# Altium footprint library WR-TBL_Wire Protector.PcbLib: 120 footprints (part 6 of 8)
Each footprint in its own frame and in the unit in brackets; x right, y up, seen from the top. Pads: shape width x height; smd on the part's side, far side on the other; paste and mask are expansions set on the pad; w line width, h text height; cw(c..) or ccw(c..) is an arc to the next point about the centre after c.
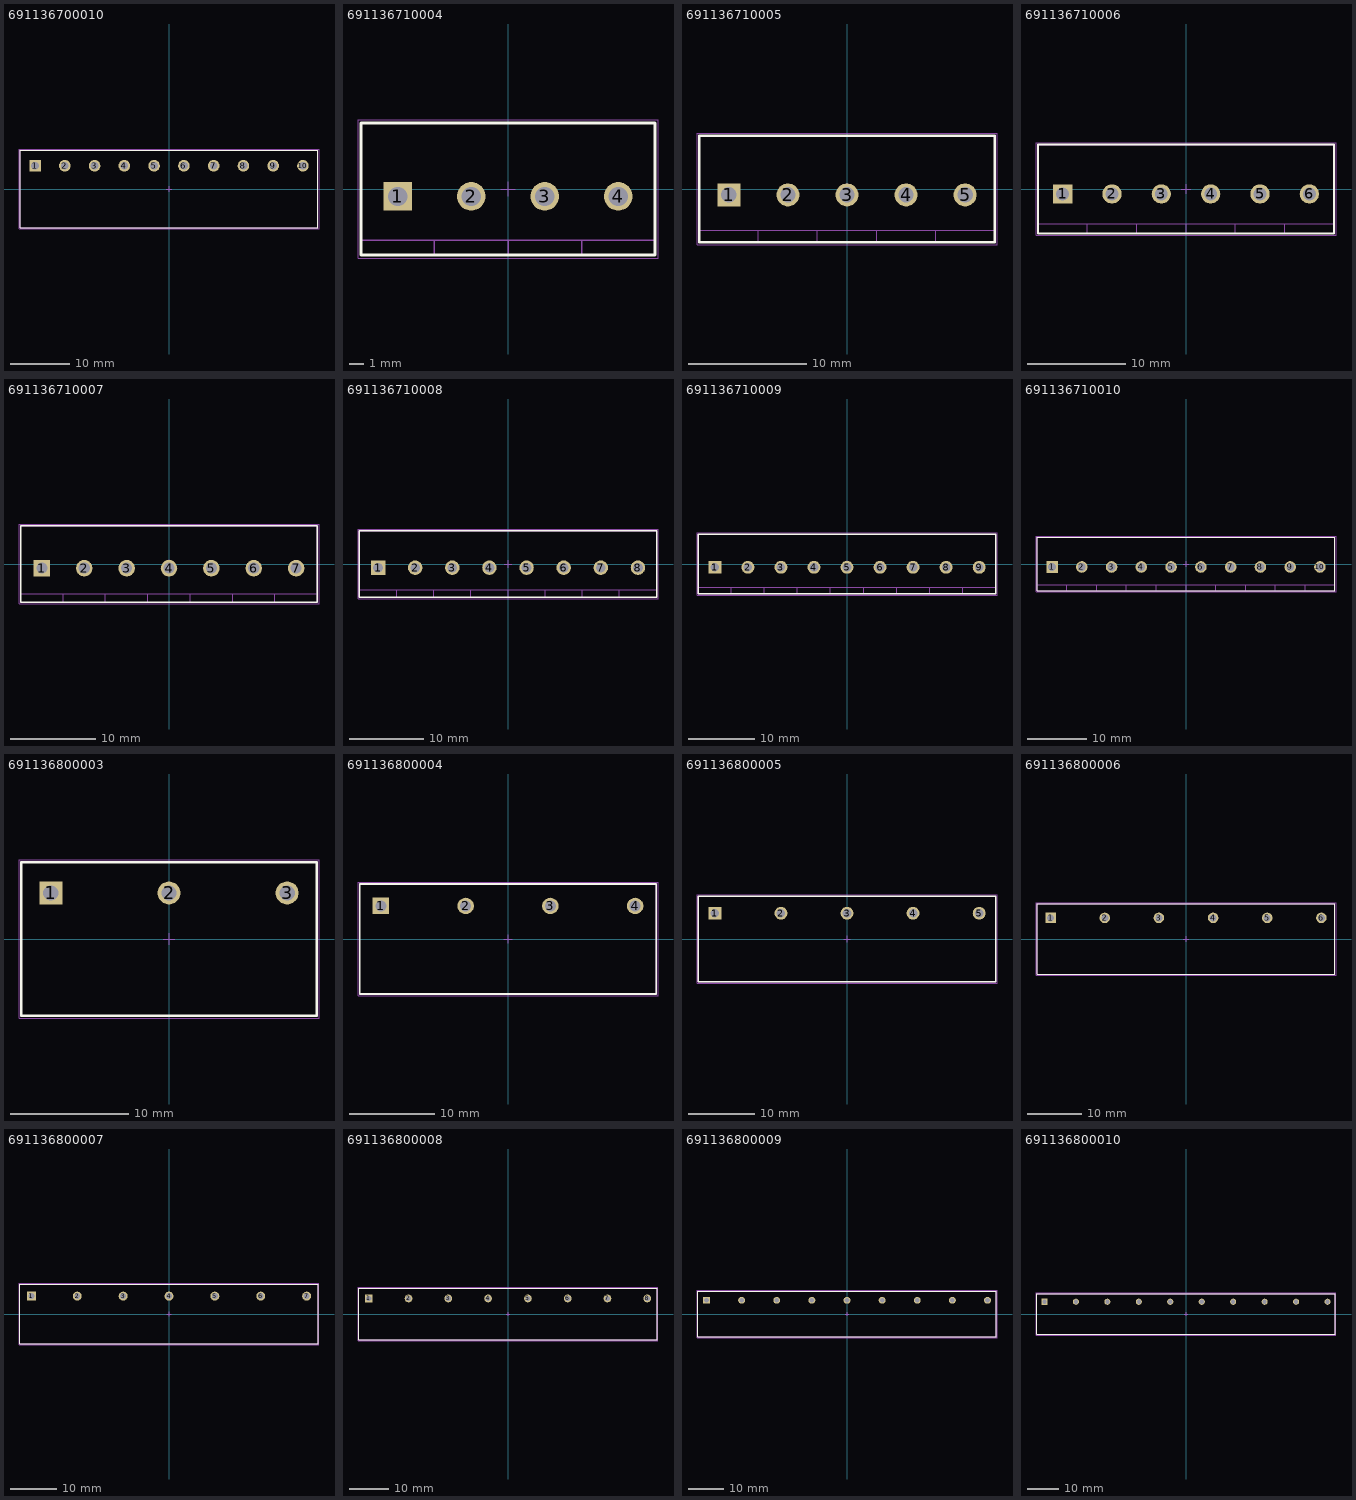
[diagram p5: the footprints below, top view; thin cyan lines are the x and y axes]

## 691136700010 [mm] "Serie 1367 - 5.00 mm _ 10 pins"
height 9
pads (10):
  rect 1.95x1.95 hole 1.3: 1(-22.5,3.9)
  round 1.95 hole 1.3: 2(-17.5,3.9) 3(-12.5,3.9) 4(-7.5,3.9) 5(-2.5,3.9) 6(2.5,3.9) 7(7.5,3.9) 8(12.5,3.9) 9(17.5,3.9) 10(22.5,3.9)
Top Overlay:
  lines w0.2: -25,-6.5 -25,6.5 25,6.5 25,-6.5 -25,-6.5
Mechanical 13:
  lines w0.1: -25,-6.5 25,-6.5 25,6.5 -25,6.5 -25,-6.5
Mechanical 15:
  lines w0.05: -0.5,0 0.5,0 ; 0,-0.5 0,0.5 ; -25.2,-6.7 -25.2,6.7 25.2,6.7 25.2,-6.7 -25.2,-6.7
3D body "691136700010.stp": height 9.1, standoff -5.9, extent -25,-6.5 25,6.5

## 691136710004 [mm] "Serie 1367 - 5.00 mm _ 4 pins"
height 13
pads (4):
  rect 1.95x1.95 hole 1.3: 1(-7.5,-0.5)
  round 1.95 hole 1.3: 2(-2.5,-0.5) 3(2.5,-0.5) 4(7.5,-0.5)
Top Overlay:
  lines w0.2: -10,-4.5 10,-4.5 10,4.5 -10,4.5 -10,-4.5
Mechanical 13:
  lines w0.1: -10,-3.5 10,-3.5 ; -5,-4.5 -5,-3.5 ; 0,-4.5 0,-3.5 ; 5,-4.5 5,-3.5 ; -10,-4.5 -10,4.5 10,4.5 10,-4.5 -10,-4.5
Mechanical 15:
  lines w0.05: -0.5,0 0.5,0 ; 0,-0.5 0,0.5 ; -10.2,-4.7 -10.2,4.7 10.2,4.7 10.2,-4.7 -10.2,-4.7
3D body "691136710004.stp": height 13.1, standoff -3.9, extent -10,-4.5 10,4.5

## 691136710005 [mm] "Serie 1367 - 5.00 mm _ 5 pins"
height 13
pads (5):
  rect 1.95x1.95 hole 1.3: 1(-10,-0.5)
  round 1.95 hole 1.3: 2(-5,-0.5) 3(0,-0.5) 4(5,-0.5) 5(10,-0.5)
Top Overlay:
  lines w0.2: -12.5,-4.5 -12.5,4.5 12.5,4.5 12.5,-4.5 -12.5,-4.5
Mechanical 13:
  lines w0.1: -12.5,-3.5 12.5,-3.5 ; -7.5,-4.5 -7.5,-3.5 ; -2.5,-4.5 -2.5,-3.5 ; 2.5,-4.5 2.5,-3.5 ; 7.5,-4.5 7.5,-3.5 ; -12.5,-4.5 12.5,-4.5 12.5,4.5 -12.5,4.5 -12.5,-4.5
Mechanical 15:
  lines w0.05: -0.5,0 0.5,0 ; 0,-0.5 0,0.5 ; -12.7,-4.7 12.7,-4.7 12.7,4.7 -12.7,4.7 -12.7,-4.7
3D body "691136710005.stp": height 13.1, standoff -3.9, extent -12.5,-4.5 12.5,4.5

## 691136710006 [mm] "Serie 1367 - 5.00 mm _ 6 pins"
height 13
pads (6):
  rect 1.95x1.95 hole 1.3: 1(-12.5,-0.5)
  round 1.95 hole 1.3: 2(-7.5,-0.5) 3(-2.5,-0.5) 4(2.5,-0.5) 5(7.5,-0.5) 6(12.5,-0.5)
Top Overlay:
  lines w0.2: -15,-4.5 15,-4.5 15,4.5 -15,4.5 -15,-4.5
Mechanical 13:
  lines w0.1: -15,-3.5 15,-3.5 ; -10,-4.5 -10,-3.5 ; -5,-4.5 -5,-3.5 ; 0,-4.5 0,-3.5 ; 5,-4.5 5,-3.5 ; 10,-4.5 10,-3.5 ; -15,-4.5 -15,4.5 15,4.5 15,-4.5 -15,-4.5
Mechanical 15:
  lines w0.05: -0.5,0 0.5,0 ; 0,-0.5 0,0.5 ; -15.2,-4.7 -15.2,4.7 15.2,4.7 15.2,-4.7 -15.2,-4.7
3D body "691136710006.stp": height 13.1, standoff -3.9, extent -15,-4.5 15,4.5

## 691136710007 [mm] "Serie 1367 - 5.00 mm _ 7 pins"
height 13
pads (7):
  rect 1.95x1.95 hole 1.3: 1(-15,-0.5)
  round 1.95 hole 1.3: 2(-10,-0.5) 3(-5,-0.5) 4(0,-0.5) 5(5,-0.5) 6(10,-0.5) 7(15,-0.5)
Top Overlay:
  lines w0.2: -17.5,-4.5 -17.5,4.5 17.5,4.5 17.5,-4.5 -17.5,-4.5
Mechanical 13:
  lines w0.1: -17.5,-3.5 17.5,-3.5 ; -12.5,-4.5 -12.5,-3.5 ; -7.5,-4.5 -7.5,-3.5 ; -2.5,-4.5 -2.5,-3.5 ; 2.5,-4.5 2.5,-3.5 ; 7.5,-4.5 7.5,-3.5 ; 12.5,-4.5 12.5,-3.5 ; -17.5,-4.5 17.5,-4.5 17.5,4.5 -17.5,4.5 -17.5,-4.5
Mechanical 15:
  lines w0.05: -0.5,0 0.5,0 ; 0,-0.5 0,0.5 ; -17.7,-4.7 17.7,-4.7 17.7,4.7 -17.7,4.7 -17.7,-4.7
3D body "691136710007.stp": height 13.1, standoff -3.9, extent -17.5,-4.5 17.5,4.5

## 691136710008 [mm] "Serie 1367 - 5.00 mm _ 8 pins"
height 13
pads (8):
  rect 1.95x1.95 hole 1.3: 1(-17.5,-0.5)
  round 1.95 hole 1.3: 2(-12.5,-0.5) 3(-7.5,-0.5) 4(-2.5,-0.5) 5(2.5,-0.5) 6(7.5,-0.5) 7(12.5,-0.5) 8(17.5,-0.5)
Top Overlay:
  lines w0.2: -20,-4.5 -20,4.5 20,4.5 20,-4.5 -20,-4.5
Mechanical 13:
  lines w0.1: -20,-3.5 20,-3.5 ; -15,-4.5 -15,-3.5 ; -10,-4.5 -10,-3.5 ; -5,-4.5 -5,-3.5 ; 0,-4.5 0,-3.5 ; 5,-4.5 5,-3.5 ; 10,-4.5 10,-3.5 ; 15,-4.5 15,-3.5 ; -20,-4.5 20,-4.5 20,4.5 -20,4.5 -20,-4.5
Mechanical 15:
  lines w0.05: -0.5,0 0.5,0 ; 0,-0.5 0,0.5 ; -20.2,-4.7 20.2,-4.7 20.2,4.7 -20.2,4.7 -20.2,-4.7
3D body "691136710008.stp": height 13.1, standoff -3.9, extent -20,-4.5 20,4.5

## 691136710009 [mm] "Serie 1367 - 5.00 mm _ 9 pins"
height 13
pads (9):
  rect 1.95x1.95 hole 1.3: 1(-20,-0.5)
  round 1.95 hole 1.3: 2(-15,-0.5) 3(-10,-0.5) 4(-5,-0.5) 5(0,-0.5) 6(5,-0.5) 7(10,-0.5) 8(15,-0.5) 9(20,-0.5)
Top Overlay:
  lines w0.2: -22.5,-4.5 22.5,-4.5 22.5,4.5 -22.5,4.5 -22.5,-4.5
Mechanical 13:
  lines w0.1: -22.5,-3.5 22.5,-3.5 ; -17.5,-4.5 -17.5,-3.5 ; -12.5,-4.5 -12.5,-3.5 ; -7.5,-4.5 -7.5,-3.5 ; -2.5,-4.5 -2.5,-3.5 ; 2.5,-4.5 2.5,-3.5 ; 7.5,-4.5 7.5,-3.5 ; 12.5,-4.5 12.5,-3.5 ; 17.5,-4.5 17.5,-3.5 ; -22.5,-4.5 -22.5,4.5 22.5,4.5 22.5,-4.5 -22.5,-4.5
Mechanical 15:
  lines w0.05: -0.5,0 0.5,0 ; 0,-0.5 0,0.5 ; -22.7,-4.7 -22.7,4.7 22.7,4.7 22.7,-4.7 -22.7,-4.7
3D body "691136710009.stp": height 13.1, standoff -3.9, extent -22.5,-4.5 22.5,4.5

## 691136710010 [mm] "Serie 1367 - 5.00 mm _ 10 pins"
height 13
pads (10):
  rect 1.95x1.95 hole 1.3: 1(-22.5,-0.5)
  round 1.95 hole 1.3: 2(-17.5,-0.5) 3(-12.5,-0.5) 4(-7.5,-0.5) 5(-2.5,-0.5) 6(2.5,-0.5) 7(7.5,-0.5) 8(12.5,-0.5) 9(17.5,-0.5) 10(22.5,-0.5)
Top Overlay:
  lines w0.2: -25,-4.5 25,-4.5 25,4.5 -25,4.5 -25,-4.5
Mechanical 13:
  lines w0.1: -25,-3.5 25,-3.5 ; -20,-4.5 -20,-3.5 ; -15,-4.5 -15,-3.5 ; -10,-4.5 -10,-3.5 ; -5,-4.5 -5,-3.5 ; 0,-4.5 0,-3.5 ; 5,-4.5 5,-3.5 ; 10,-4.5 10,-3.5 ; 15,-4.5 15,-3.5 ; 20,-4.5 20,-3.5 ; -25,-4.5 -25,4.5 25,4.5 25,-4.5 -25,-4.5
Mechanical 15:
  lines w0.05: -0.5,0 0.5,0 ; 0,-0.5 0,0.5 ; -25.2,-4.7 -25.2,4.7 25.2,4.7 25.2,-4.7 -25.2,-4.7
3D body "691136710010.stp": height 13.1, standoff -3.9, extent -25,-4.5 25,4.5

## 691136800003 [mm] "Serie 1368 - 10.00 mm _ 3 pins"
height 9
pads (3):
  rect 1.95x1.95 hole 1.3: 1(-10,3.9)
  round 1.95 hole 1.3: 2(0,3.9) 3(10,3.9)
Top Overlay:
  lines w0.2: -12.5,-6.5 12.5,-6.5 12.5,6.5 -12.5,6.5 -12.5,-6.5
Mechanical 13:
  lines w0.1: -12.5,-6.5 -12.5,6.5 12.5,6.5 12.5,-6.5 -12.5,-6.5
Mechanical 15:
  lines w0.05: -0.5,0 0.5,0 ; 0,-0.5 0,0.5 ; -12.7,-6.7 -12.7,6.7 12.7,6.7 12.7,-6.7 -12.7,-6.7
3D body "691136800003.stp": height 9.2, standoff -5.8, extent -12.5,-6.5 12.5,6.5

## 691136800004 [mm] "Serie 1368 - 10.00 mm _ 4 pins"
height 9
pads (4):
  rect 1.95x1.95 hole 1.3: 1(-15,3.9)
  round 1.95 hole 1.3: 2(-5,3.9) 3(5,3.9) 4(15,3.9)
Top Overlay:
  lines w0.2: -17.5,-6.5 -17.5,6.5 17.5,6.5 17.5,-6.5 -17.5,-6.5
Mechanical 13:
  lines w0.1: -17.5,-6.5 17.5,-6.5 17.5,6.5 -17.5,6.5 -17.5,-6.5
Mechanical 15:
  lines w0.05: -0.5,0 0.5,0 ; 0,-0.5 0,0.5 ; -17.7,-6.7 17.7,-6.7 17.7,6.7 -17.7,6.7 -17.7,-6.7
3D body "691136800004.stp": height 9.2, standoff -5.8, extent -17.5,-6.5 17.5,6.5

## 691136800005 [mm] "Serie 1368 - 10.00 mm _ 5 pins"
height 9
pads (5):
  rect 1.95x1.95 hole 1.3: 1(-20,3.9)
  round 1.95 hole 1.3: 2(-10,3.9) 3(0,3.9) 4(10,3.9) 5(20,3.9)
Top Overlay:
  lines w0.2: -22.5,-6.5 22.5,-6.5 22.5,6.5 -22.5,6.5 -22.5,-6.5
Mechanical 13:
  lines w0.1: -22.5,-6.5 -22.5,6.5 22.5,6.5 22.5,-6.5 -22.5,-6.5
Mechanical 15:
  lines w0.05: -0.5,0 0.5,0 ; 0,-0.5 0,0.5 ; -22.7,-6.7 -22.7,6.7 22.7,6.7 22.7,-6.7 -22.7,-6.7
3D body "691136800005.stp": height 9.2, standoff -5.8, extent -22.5,-6.5 22.5,6.5

## 691136800006 [mm] "Serie 1368 - 10.00 mm _ 6 pins"
height 9
pads (6):
  rect 1.95x1.95 hole 1.3: 1(-25,3.9)
  round 1.95 hole 1.3: 2(-15,3.9) 3(-5,3.9) 4(5,3.9) 5(15,3.9) 6(25,3.9)
Top Overlay:
  lines w0.2: -27.5,-6.5 -27.5,6.5 27.5,6.5 27.5,-6.5 -27.5,-6.5
Mechanical 13:
  lines w0.1: -27.5,-6.5 27.5,-6.5 27.5,6.5 -27.5,6.5 -27.5,-6.5
Mechanical 15:
  lines w0.05: -0.5,0 0.5,0 ; 0,-0.5 0,0.5 ; -27.7,-6.7 27.7,-6.7 27.7,6.7 -27.7,6.7 -27.7,-6.7
3D body "691136800006.stp": height 9.2, standoff -5.8, extent -27.5,-6.5 27.5,6.5

## 691136800007 [mm] "Serie 1368 - 10.00 mm _ 7 pins"
height 9
pads (7):
  rect 1.95x1.95 hole 1.3: 1(-30,3.9)
  round 1.95 hole 1.3: 2(-20,3.9) 3(-10,3.9) 4(0,3.9) 5(10,3.9) 6(20,3.9) 7(30,3.9)
Top Overlay:
  lines w0.2: -32.5,-6.5 -32.5,6.5 32.5,6.5 32.5,-6.5 -32.5,-6.5
Mechanical 13:
  lines w0.1: -32.5,-6.5 32.5,-6.5 32.5,6.5 -32.5,6.5 -32.5,-6.5
Mechanical 15:
  lines w0.05: -0.5,0 0.5,0 ; 0,-0.5 0,0.5 ; -32.7,-6.7 32.7,-6.7 32.7,6.7 -32.7,6.7 -32.7,-6.7
3D body "691136800007.stp": height 9.2, standoff -5.8, extent -32.5,-6.5 32.5,6.5

## 691136800008 [mm] "Serie 1368 - 10.00 mm _ 8 pins"
height 9
pads (8):
  rect 1.95x1.95 hole 1.3: 1(-35,3.9)
  round 1.95 hole 1.3: 2(-25,3.9) 3(-15,3.9) 4(-5,3.9) 5(5,3.9) 6(15,3.9) 7(25,3.9) 8(35,3.9)
Top Overlay:
  lines w0.2: -37.5,-6.5 37.5,-6.5 37.5,6.5 -37.5,6.5 -37.5,-6.5
Mechanical 13:
  lines w0.1: -37.5,-6.5 -37.5,6.5 37.5,6.5 37.5,-6.5 -37.5,-6.5
Mechanical 15:
  lines w0.05: -0.5,0 0.5,0 ; 0,-0.5 0,0.5 ; -37.7,-6.7 -37.7,6.7 37.7,6.7 37.7,-6.7 -37.7,-6.7
3D body "691136800008.stp": height 9.2, standoff -5.8, extent -37.5,-6.5 37.5,6.5

## 691136800009 [mm] "Serie 1368 - 10.00 mm _ 9 pins"
height 9
pads (9):
  rect 1.95x1.95 hole 1.3: 1(-40,3.9)
  round 1.95 hole 1.3: 2(-30,3.9) 3(-20,3.9) 4(-10,3.9) 5(0,3.9) 6(10,3.9) 7(20,3.9) 8(30,3.9) 9(40,3.9)
Top Overlay:
  lines w0.2: -42.5,-6.5 -42.5,6.5 42.5,6.5 42.5,-6.5 -42.5,-6.5
Mechanical 13:
  lines w0.1: -42.5,-6.5 42.5,-6.5 42.5,6.5 -42.5,6.5 -42.5,-6.5
Mechanical 15:
  lines w0.05: -0.5,0 0.5,0 ; 0,-0.5 0,0.5 ; -42.7,-6.7 42.7,-6.7 42.7,6.7 -42.7,6.7 -42.7,-6.7
3D body "691136800009.stp": height 9.2, standoff -5.8, extent -42.5,-6.5 42.5,6.5

## 691136800010 [mm] "Serie 1368 - 10.00 mm _ 10 pins"
height 9
pads (10):
  rect 1.95x1.95 hole 1.3: 1(-45,3.9)
  round 1.95 hole 1.3: 2(-35,3.9) 3(-25,3.9) 4(-15,3.9) 5(-5,3.9) 6(5,3.9) 7(15,3.9) 8(25,3.9) 9(35,3.9) 10(45,3.9)
Top Overlay:
  lines w0.2: -47.5,-6.5 47.5,-6.5 47.5,6.5 -47.5,6.5 -47.5,-6.5
Mechanical 13:
  lines w0.1: -47.5,-6.5 -47.5,6.5 47.5,6.5 47.5,-6.5 -47.5,-6.5
Mechanical 15:
  lines w0.05: -0.5,0 0.5,0 ; 0,-0.5 0,0.5 ; -47.7,-6.7 -47.7,6.7 47.7,6.7 47.7,-6.7 -47.7,-6.7
3D body "691136800010.stp": height 9.2, standoff -5.8, extent -47.5,-6.5 47.5,6.5